# Altium footprint library heromap.PcbLib: 593 footprints (part 24 of 38)
Each footprint in its own frame and in the unit in brackets; x right, y up, seen from the top. Pads: shape width x height; smd on the part's side, far side on the other; paste and mask are expansions set on the pad; w line width, h text height; cw(c..) or ccw(c..) is an arc to the next point about the centre after c.
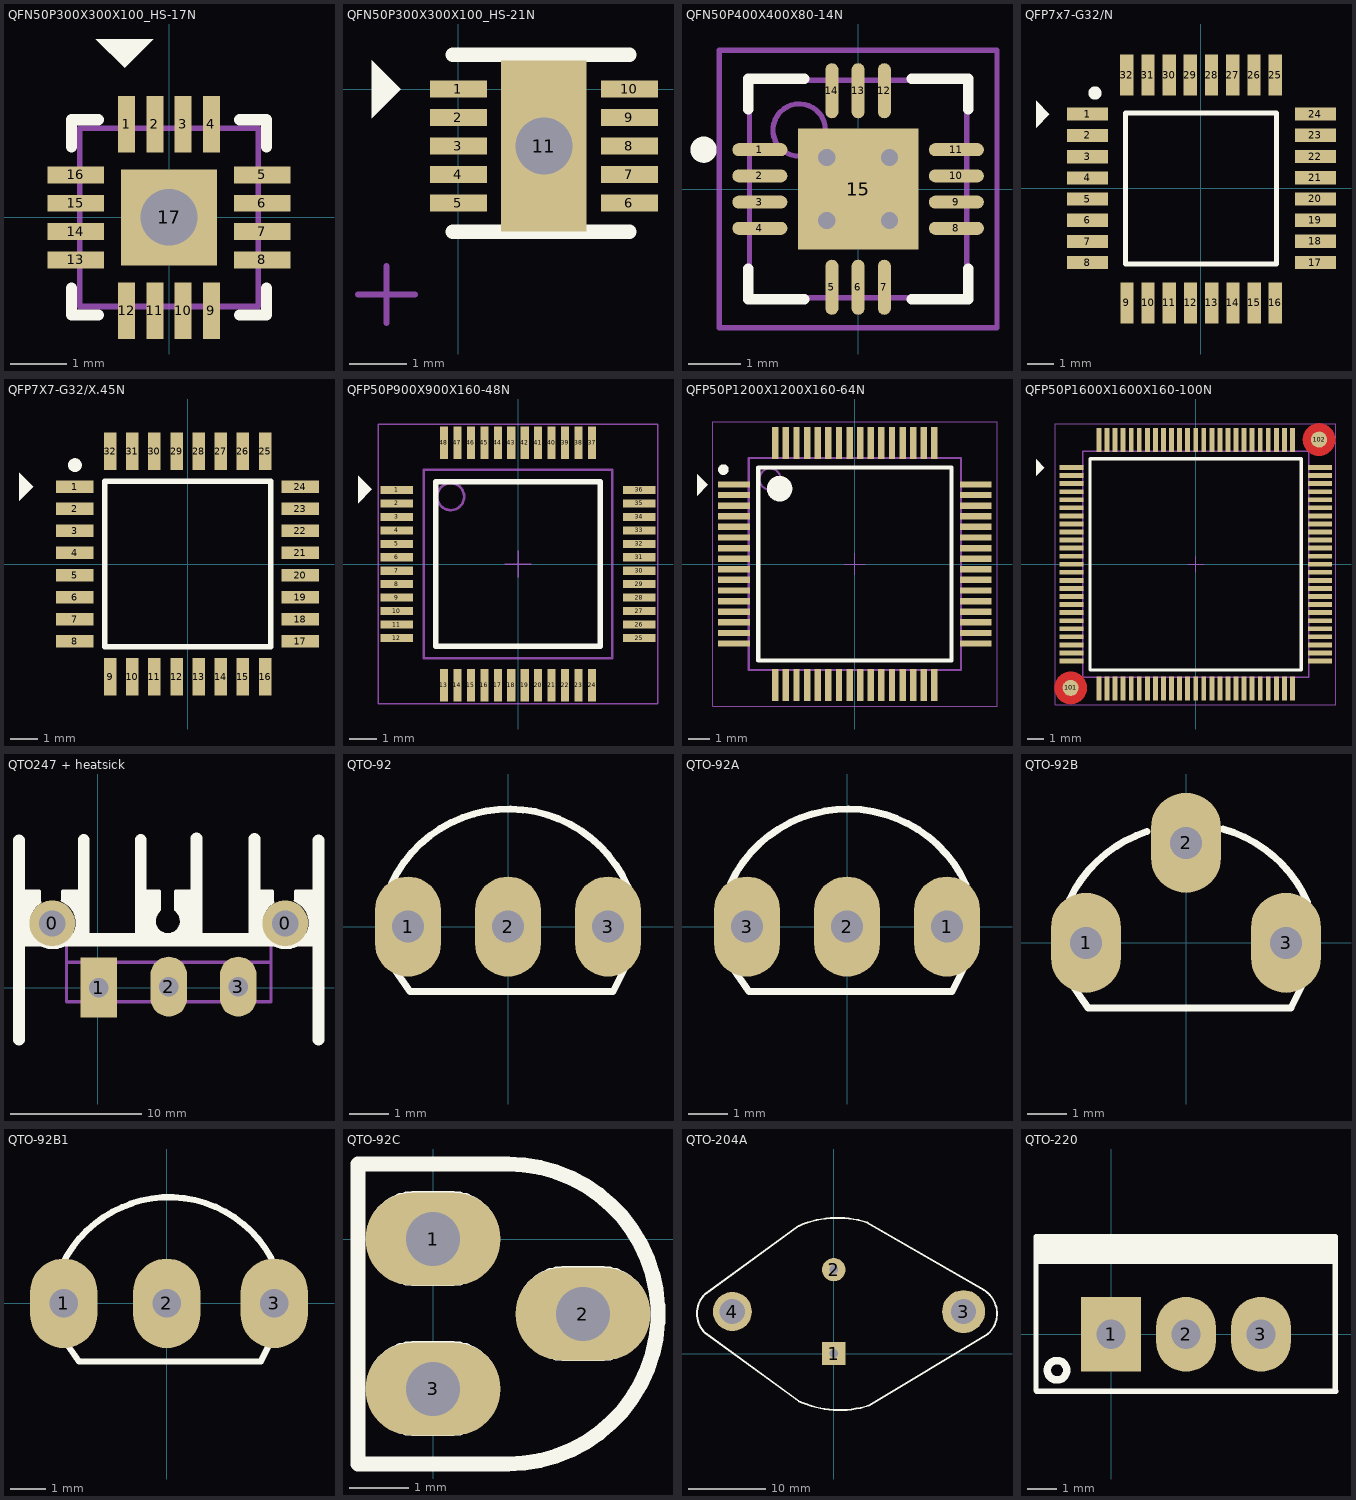
[diagram p23: the footprints below, top view; thin cyan lines are the x and y axes]

## QFN50P300X300X100_HS-17N [mm] "QFN, 16-Leads, Body 3,00x3,00mm, Pitch 0,50mm, Thermal Pad 2,40x1,65mm, IPC Medium Density"
height 1
pads (17):
  rect 0.3x1 smd: 1(-0.75,1.65) 2(-0.25,1.65) 3(0.25,1.65) 4(0.75,1.65) 9(0.75,-1.65) 10(0.25,-1.65) 11(-0.25,-1.65) 12(-0.75,-1.65)
  rect 1x0.3 smd: 5(1.65,0.75) 6(1.65,0.25) 7(1.65,-0.25) 8(1.65,-0.75) 13(-1.65,-0.75) 14(-1.65,-0.25) 15(-1.65,0.25) 16(-1.65,0.75)
  rect 1.7x1.7 smd: 17(0,0)
via 0,0 diameter 1.5 hole 1
Top Overlay:
  region: -0.275,3.154 -0.783,2.646 -1.291,3.154
  lines w0.2: -1.725,-1.25 -1.725,-1.725 -1.25,-1.725 ; -1.725,1.25 -1.725,1.725 -1.25,1.725 ; 1.25,-1.725 1.725,-1.725 1.725,-1.25 ; 1.25,1.725 1.725,1.725 1.725,1.25
Mechanical 13:
  lines w0.1: -1.575,-1.575 1.575,-1.575 1.575,1.575 -1.575,1.575 -1.575,-1.575
Mechanical 15:
  lines w0.1: -0.5,0 0.5,0 ; 0,-0.5 0,0.5
3D body: height 1, standoff 0.01, extent -1.575,-1.575 1.575,1.575

## QFN50P300X300X100_HS-21N [mm] "QFN, 20-Leads, Body 3,00x3,00mm, Pitch 0,50mm, Thermal Pad 2,40x1,65mm, IPC Medium Density"
height 1
pads (11):
  rect 1x0.3 smd: 1(0,0) 2(0,-0.5) 3(0,-1) 4(0,-1.5) 5(0,-2) 6(3,-2) 7(3,-1.5) 8(3,-1) 9(3,-0.5) 10(3,0)
  rect 1.5x3 hole 1: 11(1.5,-1)
Top Overlay:
  region: -1.524,0.508 -1.016,0 -1.524,-0.508
  lines w0.254: -0.1,-2.5 3,-2.5 ; -0.1,0.6 3,0.6
Mechanical 15:
  lines w0.1: -1.762,-3.603 -0.762,-3.603 ; -1.262,-4.103 -1.262,-3.103
3D body: height 1, standoff 0.1, extent -0.1,-2.5 3,0.6

## QFN50P400X400X80-14N [mm] "QFN, 14-Leads, Body 4,2x4,2mm (max), Pitch 0,50mm, IPC Medium Density"
height 0.8
pads (15):
  oval 1.05x0.25 smd: 1(-1.875,0.75) 2(-1.875,0.25) 3(-1.875,-0.25) 4(-1.875,-0.75) 8(1.875,-0.75) 9(1.875,-0.25) 10(1.875,0.25) 11(1.875,0.75)
  oval 0.25x1.05 smd: 5(-0.5,-1.875) 6(0,-1.875) 7(0.5,-1.875) 12(0.5,1.875) 13(0,1.875) 14(-0.5,1.875)
  rect 2.3x2.3 smd: 15(0,0)
via 0.6,-0.6 diameter 0.66 hole 0.33
via -0.6,-0.6 diameter 0.66 hole 0.33
via 0.6,0.6 diameter 0.66 hole 0.33
via -0.6,0.6 diameter 0.66 hole 0.33
Top Overlay:
  circle w0.25: c-2.95,0.75 r0.125
  lines w0.2: -2.1,-1.525 -2.1,-2.1 -1.025,-2.1 ; -2.1,1.525 -2.1,2.1 -1.025,2.1 ; 1.025,-2.1 2.1,-2.1 2.1,-1.525 ; 1.025,2.1 2.1,2.1 2.1,1.525
Mechanical 13:
  circle w0.1: c-1.125,1.125 r0.5
  lines w0.1: -2.075,-2.075 2.075,-2.075 2.075,2.075 -2.075,2.075 -2.075,-2.075
Mechanical 15:
  lines w0.1: -0.5,0 0.5,0 ; 0,-0.5 0,0.5 ; -2.65,-2.65 2.65,-2.65 2.65,2.65 -2.65,2.65 -2.65,-2.65
3D body: height 0.8, standoff 0.01, extent -2.075,-2.075 2.075,2.075

## QFP7x7-G32/N [mm] "32-Pin Plastic Thin Quad Flat Pack (TFQP)"
height 1.2
pads (32):
  rect 1.55x0.5 smd: 1(-4.279,2.806) 2(-4.279,2) 3(-4.279,1.2) 4(-4.279,0.4) 5(-4.279,-0.4) 6(-4.279,-1.2) 7(-4.279,-2) 8(-4.279,-2.794) 17(4.318,-2.794) 18(4.318,-1.994) 19(4.318,-1.194) 20(4.318,-0.394) 21(4.318,0.406) 22(4.318,1.206) 23(4.318,2.006) 24(4.318,2.806)
  rect 0.5x1.55 smd: 9(-2.794,-4.318) 10(-1.994,-4.318) 11(-1.194,-4.318) 12(-0.394,-4.318) 13(0.406,-4.318) 14(1.206,-4.318) 15(2.006,-4.318) 16(2.806,-4.318) 25(2.8,4.279) 26(2,4.279) 27(1.2,4.279) 28(0.4,4.279) 29(-0.4,4.279) 30(-1.2,4.279) 31(-2,4.279) 32(-2.8,4.279)
Top Overlay:
  circle w0.25: c-4,3.6 r0.125
  region: -6.223,3.302 -5.715,2.794 -6.223,2.286
  lines w0.2: -2.85,-2.85 -2.85,2.85 2.85,2.85 2.85,-2.85 -2.85,-2.85
3D body "atmega8 (tqfp32)_V2008.STEP": height 1.13, standoff 0.02, extent -4.774,-4.774 4.826,4.826

## QFP7X7-G32/X.45N [mm] "QFP; 32 Leads; Body 7 x 7 mm; Pitch 0.8 mm"
height 1.6
pads (32):
  rect 1.35x0.45 smd: 1(-4.075,2.8) 2(-4.075,2) 3(-4.075,1.2) 4(-4.075,0.4) 5(-4.075,-0.4) 6(-4.075,-1.2) 7(-4.075,-2) 8(-4.075,-2.8) 17(4.075,-2.8) 18(4.075,-2) 19(4.075,-1.2) 20(4.075,-0.4) 21(4.075,0.4) 22(4.075,1.2) 23(4.075,2) 24(4.075,2.8)
  rect 0.45x1.35 smd: 9(-2.8,-4.075) 10(-2,-4.075) 11(-1.2,-4.075) 12(-0.4,-4.075) 13(0.4,-4.075) 14(1.2,-4.075) 15(2,-4.075) 16(2.8,-4.075) 25(2.8,4.075) 26(2,4.075) 27(1.2,4.075) 28(0.4,4.075) 29(-0.4,4.075) 30(-1.2,4.075) 31(-2,4.075) 32(-2.8,4.075)
Top Overlay:
  circle w0.25: c-4.075,3.575 r0.125
  region: -6.096,3.308 -5.588,2.8 -6.096,2.292
  lines w0.2: -3,-3 3,-3 3,3 -3,3 -3,-3
3D body "atmega8 (tqfp32)_V2008.STEP": height 1.2, standoff 0.09, extent -4.8,-4.8 4.8,4.8

## QFP50P900X900X160-48N [mm] "QFP,0.50mm pitch,square;12 pin X 12 pin,7.00mm X 7.00mm X 1.60mm H body"
height 1.6
pads (48):
  rect 1.2x0.3 smd: 1(-4.5,2.75) 2(-4.5,2.25) 3(-4.5,1.75) 4(-4.5,1.25) 5(-4.5,0.75) 6(-4.5,0.25) 7(-4.5,-0.25) 8(-4.5,-0.75) 9(-4.5,-1.25) 10(-4.5,-1.75) 11(-4.5,-2.25) 12(-4.5,-2.75) 25(4.5,-2.75) 26(4.5,-2.25) 27(4.5,-1.75) 28(4.5,-1.25) 29(4.5,-0.75) 30(4.5,-0.25) 31(4.5,0.25) 32(4.5,0.75) 33(4.5,1.25) 34(4.5,1.75) 35(4.5,2.25) 36(4.5,2.75)
  rect 0.3x1.2 smd: 13(-2.75,-4.5) 14(-2.25,-4.5) 15(-1.75,-4.5) 16(-1.25,-4.5) 17(-0.75,-4.5) 18(-0.25,-4.5) 19(0.25,-4.5) 20(0.75,-4.5) 21(1.25,-4.5) 22(1.75,-4.5) 23(2.25,-4.5) 24(2.75,-4.5) 37(2.75,4.5) 38(2.25,4.5) 39(1.75,4.5) 40(1.25,4.5) 41(0.75,4.5) 42(0.25,4.5) 43(-0.25,4.5) 44(-0.75,4.5) 45(-1.25,4.5) 46(-1.75,4.5) 47(-2.25,4.5) 48(-2.75,4.5)
Top Overlay:
  region: -5.944,3.277 -5.436,2.769 -5.944,2.261
  lines w0.2: -3.05,-3.05 3.05,-3.05 3.05,3.05 -3.05,3.05 -3.05,-3.05
Mechanical 12:
  lines w0.001: -3.5,-3.5 3.5,-3.5 3.5,3.5 -3.5,3.5 -3.5,-3.5
Mechanical 13:
  circle w0.1: c-2.5,2.5 r0.5
  lines w0.1: -3.5,-3.5 3.5,-3.5 3.5,3.5 -3.5,3.5 -3.5,-3.5
Mechanical 15:
  lines w0.05: -0.5,0 0.5,0 ; 0,-0.5 0,0.5 ; -5.2,-5.2 5.2,-5.2 5.2,5.2 -5.2,5.2 -5.2,-5.2
3D body "SW3dPS-P-LQFP48-7x7-0.50.STEP": height 1.42, standoff -0.03, extent -4.496,-4.496 4.504,4.504

## QFP50P1200X1200X160-64N [mm] "QFP,0.50mm pitch,square;16 pin X 16 pin,10.00mm X 10.00mm X 1.60mm H body"
height 1.6
pads (64):
  rect 1.5x0.3 smd: 1(-5.7,3.75) 2(-5.7,3.25) 3(-5.7,2.75) 4(-5.7,2.25) 5(-5.7,1.75) 6(-5.7,1.25) 7(-5.7,0.75) 8(-5.7,0.25) 9(-5.7,-0.25) 10(-5.7,-0.75) 11(-5.7,-1.25) 12(-5.7,-1.75) 13(-5.7,-2.25) 14(-5.7,-2.75) 15(-5.7,-3.25) 16(-5.7,-3.75) 33(5.7,-3.75) 34(5.7,-3.25) 35(5.7,-2.75) 36(5.7,-2.25) 37(5.7,-1.75) 38(5.7,-1.25) 39(5.7,-0.75) 40(5.7,-0.25) 41(5.7,0.25) 42(5.7,0.75) 43(5.7,1.25) 44(5.7,1.75) 45(5.7,2.25) 46(5.7,2.75) 47(5.7,3.25) 48(5.7,3.75)
  rect 0.3x1.5 smd: 17(-3.75,-5.7) 18(-3.25,-5.7) 19(-2.75,-5.7) 20(-2.25,-5.7) 21(-1.75,-5.7) 22(-1.25,-5.7) 23(-0.75,-5.7) 24(-0.25,-5.7) 25(0.25,-5.7) 26(0.75,-5.7) 27(1.25,-5.7) 28(1.75,-5.7) 29(2.25,-5.7) 30(2.75,-5.7) 31(3.25,-5.7) 32(3.75,-5.7) 49(3.75,5.7) 50(3.25,5.7) 51(2.75,5.7) 52(2.25,5.7) 53(1.75,5.7) 54(1.25,5.7) 55(0.75,5.7) 56(0.25,5.7) 57(-0.25,5.7) 58(-0.75,5.7) 59(-1.25,5.7) 60(-1.75,5.7) 61(-2.25,5.7) 62(-2.75,5.7) 63(-3.25,5.7) 64(-3.75,5.7)
Top Overlay:
  circle w0.6: c-3.55,3.55 r0.3
  circle w0.25: c-6.2,4.45 r0.125
  region: -7.442,4.242 -6.934,3.734 -7.442,3.226
  lines w0.2: -4.55,-4.55 4.55,-4.55 4.55,4.55 -4.55,4.55 -4.55,-4.55
Mechanical 12:
  lines w0.001: -5,-5 5,-5 5,5 -5,5 -5,-5
Mechanical 13:
  circle w0.1: c-4,4 r0.5
  lines w0.1: -5,-5 5,-5 5,5 -5,5 -5,-5
Mechanical 15:
  lines w0.05: -0.5,0 0.5,0 ; 0,-0.5 0,0.5 ; -6.7,-6.7 6.7,-6.7 6.7,6.7 -6.7,6.7 -6.7,-6.7

## QFP50P1600X1600X160-100N [mm] "QFP,0.50mm pitch,square;25 pin X 25 pin,14.00mm X 14.00mm X 1.60mm H body"
height 1.6
pads (102):
  rect 1.5x0.3 smd: 1(-7.7,6) 2(-7.7,5.5) 3(-7.7,5) 4(-7.7,4.5) 5(-7.7,4) 6(-7.7,3.5) 7(-7.7,3) 8(-7.7,2.5) 9(-7.7,2) 10(-7.7,1.5) 11(-7.7,1) 12(-7.7,0.5) 13(-7.7,0) 14(-7.7,-0.5) 15(-7.7,-1) 16(-7.7,-1.5) 17(-7.7,-2) 18(-7.7,-2.5) 19(-7.7,-3) 20(-7.7,-3.5) 21(-7.7,-4) 22(-7.7,-4.5) 23(-7.7,-5) 24(-7.7,-5.5) 25(-7.7,-6) 51(7.7,-6) 52(7.7,-5.5) 53(7.7,-5) 54(7.7,-4.5) 55(7.7,-4) 56(7.7,-3.5) 57(7.7,-3) 58(7.7,-2.5) 59(7.7,-2) 60(7.7,-1.5) 61(7.7,-1) 62(7.7,-0.5) 63(7.7,0) 64(7.7,0.5) 65(7.7,1) 66(7.7,1.5) 67(7.7,2) 68(7.7,2.5) 69(7.7,3) 70(7.7,3.5) 71(7.7,4) 72(7.7,4.5) 73(7.7,5) 74(7.7,5.5) 75(7.7,6)
  rect 0.3x1.5 smd: 26(-6,-7.7) 27(-5.5,-7.7) 28(-5,-7.7) 29(-4.5,-7.7) 30(-4,-7.7) 31(-3.5,-7.7) 32(-3,-7.7) 33(-2.5,-7.7) 34(-2,-7.7) 35(-1.5,-7.7) 36(-1,-7.7) 37(-0.5,-7.7) 38(0,-7.7) 39(0.5,-7.7) 40(1,-7.7) 41(1.5,-7.7) 42(2,-7.7) 43(2.5,-7.7) 44(3,-7.7) 45(3.5,-7.7) 46(4,-7.7) 47(4.5,-7.7) 48(5,-7.7) 49(5.5,-7.7) 50(6,-7.7) 76(6,7.7) 77(5.5,7.7) 78(5,7.7) 79(4.5,7.7) 80(4,7.7) 81(3.5,7.7) 82(3,7.7) 83(2.5,7.7) 84(2,7.7) 85(1.5,7.7) 86(1,7.7) 87(0.5,7.7) 88(0,7.7) 89(-0.5,7.7) 90(-1,7.7) 91(-1.5,7.7) 92(-2,7.7) 93(-2.5,7.7) 94(-3,7.7) 95(-3.5,7.7) 96(-4,7.7) 97(-4.5,7.7) 98(-5,7.7) 99(-5.5,7.7) 100(-6,7.7)
  round 1 smd: 101(-7.753,-7.669) 102(7.647,7.731)
Top Layer:
  pour cut-out: 153 vertices and 0 holes, not listed, extent -8.753,-8.669 -6.753,-6.669
  pour cut-out: 153 vertices and 0 holes, not listed, extent 6.647,6.731 8.647,8.731
Top Overlay:
  region: -9.906,6.508 -9.398,6 -9.906,5.492
  lines w0.2: -6.55,-6.55 -6.55,6.55 6.55,6.55 6.55,-6.55 -6.55,-6.55
Mechanical 12:
  lines w0.001: -7,-7 -7,7 7,7 7,-7 -7,-7
Mechanical 13:
  lines w0.1: -7,-7 -7,7 ; -7,-7 7,-7 ; -7,-7 -7,7 ; -7,-7 7,-7 ; -7,7 7,7 ; -7,7 7,7 ; 7,-7 7,7 ; 7,-7 7,7
Mechanical 15:
  lines w0.05: -0.5,0 0.5,0 ; 0,-0.5 0,0.5 ; -8.7,-8.7 -8.7,8.7 8.7,8.7 8.7,-8.7 -8.7,-8.7
3D body: height 1.6, standoff 0.05, extent -7,-7 7,7
3D body: height 0.85, standoff 0.75, extent -7.264,5.85 -6.807,6.147
3D body: height 0.85, standoff 0, extent -7.351,5.85 -7.264,6.147
3D body: height 0.1, standoff 0, extent -8.085,5.85 -7.351,6.147
3D body: height 0.1, standoff 0, extent -8.085,5.35 -7.351,5.647
3D body: height 0.85, standoff 0, extent -7.351,5.35 -7.264,5.647
3D body: height 0.85, standoff 0.75, extent -7.264,5.35 -6.807,5.647
3D body: height 0.1, standoff 0, extent -8.085,4.85 -7.351,5.147
3D body: height 0.85, standoff 0, extent -7.351,4.85 -7.264,5.147
3D body: height 0.85, standoff 0.75, extent -7.264,4.85 -6.807,5.147
3D body: height 0.85, standoff 0.75, extent -7.264,3.35 -6.807,3.647
3D body: height 0.85, standoff 0, extent -7.351,3.35 -7.264,3.647
3D body: height 0.1, standoff 0, extent -8.085,3.35 -7.351,3.647
3D body: height 0.85, standoff 0.75, extent -7.264,3.85 -6.807,4.147
3D body: height 0.85, standoff 0, extent -7.351,3.85 -7.264,4.147
3D body: height 0.1, standoff 0, extent -8.085,3.85 -7.351,4.147
3D body: height 0.1, standoff 0, extent -8.085,4.35 -7.351,4.647
3D body: height 0.85, standoff 0, extent -7.351,4.35 -7.264,4.647
3D body: height 0.85, standoff 0.75, extent -7.264,4.35 -6.807,4.647
3D body: height 0.85, standoff 0.75, extent -7.264,1.85 -6.807,2.147
3D body: height 0.85, standoff 0, extent -7.351,1.85 -7.264,2.147
3D body: height 0.1, standoff 0, extent -8.085,1.85 -7.351,2.147
3D body: height 0.1, standoff 0, extent -8.085,1.35 -7.351,1.647
3D body: height 0.85, standoff 0, extent -7.351,1.35 -7.264,1.647
3D body: height 0.85, standoff 0.75, extent -7.264,1.35 -6.807,1.647
3D body: height 0.85, standoff 0.75, extent -7.264,2.35 -6.807,2.647
3D body: height 0.85, standoff 0, extent -7.351,2.35 -7.264,2.647
3D body: height 0.1, standoff 0, extent -8.085,2.35 -7.351,2.647
3D body: height 0.85, standoff 0.75, extent -7.264,2.85 -6.807,3.147
3D body: height 0.85, standoff 0, extent -7.351,2.85 -7.264,3.147
3D body: height 0.1, standoff 0, extent -8.085,2.85 -7.351,3.147
3D body: height 0.1, standoff 0, extent -8.085,3.35 -7.351,3.647
3D body: height 0.85, standoff 0, extent -7.351,3.35 -7.264,3.647
3D body: height 0.85, standoff 0.75, extent -7.264,3.35 -6.807,3.647
3D body: height 0.85, standoff 0.75, extent -7.264,-0.65 -6.807,-0.353
3D body: height 0.85, standoff 0, extent -7.351,-0.65 -7.264,-0.353
3D body: height 0.1, standoff 0, extent -8.085,-0.65 -7.351,-0.353
3D body: height 0.1, standoff 0, extent -8.085,-1.15 -7.351,-0.853
3D body: height 0.85, standoff 0, extent -7.351,-1.15 -7.264,-0.853
3D body: height 0.85, standoff 0.75, extent -7.264,-1.15 -6.807,-0.853
3D body: height 0.85, standoff 0.75, extent -7.264,-0.15 -6.807,0.147
3D body: height 0.85, standoff 0, extent -7.351,-0.15 -7.264,0.147
3D body: height 0.1, standoff 0, extent -8.085,-0.15 -7.351,0.147
3D body: height 0.85, standoff 0.75, extent -7.264,0.35 -6.807,0.647
3D body: height 0.85, standoff 0, extent -7.351,0.35 -7.264,0.647
3D body: height 0.1, standoff 0, extent -8.085,0.35 -7.351,0.647
3D body: height 0.1, standoff 0, extent -8.085,0.85 -7.351,1.147
3D body: height 0.85, standoff 0, extent -7.351,0.85 -7.264,1.147
3D body: height 0.85, standoff 0.75, extent -7.264,0.85 -6.807,1.147
3D body: height 0.85, standoff 0.75, extent -7.264,-3.15 -6.807,-2.853
3D body: height 0.85, standoff 0, extent -7.351,-3.15 -7.264,-2.853
3D body: height 0.1, standoff 0, extent -8.085,-3.15 -7.351,-2.853
3D body: height 0.1, standoff 0, extent -8.085,-3.65 -7.351,-3.353
3D body: height 0.85, standoff 0, extent -7.351,-3.65 -7.264,-3.353
3D body: height 0.85, standoff 0.75, extent -7.264,-3.65 -6.807,-3.353
3D body: height 0.85, standoff 0.75, extent -7.264,-2.65 -6.807,-2.353
3D body: height 0.85, standoff 0, extent -7.351,-2.65 -7.264,-2.353
3D body: height 0.1, standoff 0, extent -8.085,-2.65 -7.351,-2.353
3D body: height 0.85, standoff 0.75, extent -7.264,-2.15 -6.807,-1.853
3D body: height 0.85, standoff 0, extent -7.351,-2.15 -7.264,-1.853
3D body: height 0.1, standoff 0, extent -8.085,-2.15 -7.351,-1.853
3D body: height 0.1, standoff 0, extent -8.085,-1.65 -7.351,-1.353
3D body: height 0.85, standoff 0, extent -7.351,-1.65 -7.264,-1.353
3D body: height 0.85, standoff 0.75, extent -7.264,-1.65 -6.807,-1.353
3D body: height 0.85, standoff 0.75, extent -7.264,-5.65 -6.807,-5.353
3D body: height 0.85, standoff 0, extent -7.351,-5.65 -7.264,-5.353
3D body: height 0.1, standoff 0, extent -8.085,-5.65 -7.351,-5.353
3D body: height 0.1, standoff 0, extent -8.085,-6.15 -7.351,-5.853
3D body: height 0.85, standoff 0, extent -7.351,-6.15 -7.264,-5.853
3D body: height 0.85, standoff 0.75, extent -7.264,-6.15 -6.807,-5.853
3D body: height 0.85, standoff 0.75, extent -7.264,-5.15 -6.807,-4.853
3D body: height 0.85, standoff 0, extent -7.351,-5.15 -7.264,-4.853
3D body: height 0.1, standoff 0, extent -8.085,-5.15 -7.351,-4.853
3D body: height 0.85, standoff 0.75, extent -7.264,-4.65 -6.807,-4.353
3D body: height 0.85, standoff 0, extent -7.351,-4.65 -7.264,-4.353
3D body: height 0.1, standoff 0, extent -8.085,-4.65 -7.351,-4.353
3D body: height 0.1, standoff 0, extent -8.085,-4.15 -7.351,-3.853
3D body: height 0.85, standoff 0, extent -7.351,-4.15 -7.264,-3.853
3D body: height 0.85, standoff 0.75, extent -7.264,-4.15 -6.807,-3.853
3D body: height 0.85, standoff 0.75, extent 3.853,-7.264 4.15,-6.807
3D body: height 0.85, standoff 0, extent 3.853,-7.351 4.15,-7.264
3D body: height 0.1, standoff 0, extent 3.853,-8.085 4.15,-7.351
3D body: height 0.1, standoff 0, extent 4.353,-8.085 4.65,-7.351
3D body: height 0.85, standoff 0, extent 4.353,-7.351 4.65,-7.264
3D body: height 0.85, standoff 0.75, extent 4.353,-7.264 4.65,-6.807
3D body: height 0.1, standoff 0, extent 4.853,-8.085 5.15,-7.351
3D body: height 0.85, standoff 0, extent 4.853,-7.351 5.15,-7.264
3D body: height 0.85, standoff 0.75, extent 4.853,-7.264 5.15,-6.807
3D body: height 0.85, standoff 0.75, extent 5.853,-7.264 6.15,-6.807
3D body: height 0.85, standoff 0, extent 5.853,-7.351 6.15,-7.264
3D body: height 0.1, standoff 0, extent 5.853,-8.085 6.15,-7.351
3D body: height 0.1, standoff 0, extent 5.353,-8.085 5.65,-7.351
3D body: height 0.85, standoff 0, extent 5.353,-7.351 5.65,-7.264
3D body: height 0.85, standoff 0.75, extent 5.353,-7.264 5.65,-6.807
3D body: height 0.85, standoff 0.75, extent 1.353,-7.264 1.65,-6.807
3D body: height 0.85, standoff 0, extent 1.353,-7.351 1.65,-7.264
3D body: height 0.1, standoff 0, extent 1.353,-8.085 1.65,-7.351
3D body: height 0.1, standoff 0, extent 1.853,-8.085 2.15,-7.351
3D body: height 0.85, standoff 0, extent 1.853,-7.351 2.15,-7.264
3D body: height 0.85, standoff 0.75, extent 1.853,-7.264 2.15,-6.807
3D body: height 0.1, standoff 0, extent 2.353,-8.085 2.65,-7.351
3D body: height 0.85, standoff 0, extent 2.353,-7.351 2.65,-7.264
3D body: height 0.85, standoff 0.75, extent 2.353,-7.264 2.65,-6.807
3D body: height 0.85, standoff 0.75, extent 3.353,-7.264 3.65,-6.807
3D body: height 0.85, standoff 0, extent 3.353,-7.351 3.65,-7.264
3D body: height 0.1, standoff 0, extent 3.353,-8.085 3.65,-7.351
3D body: height 0.1, standoff 0, extent 2.853,-8.085 3.15,-7.351
3D body: height 0.85, standoff 0, extent 2.853,-7.351 3.15,-7.264
3D body: height 0.85, standoff 0.75, extent 2.853,-7.264 3.15,-6.807
3D body: height 0.85, standoff 0.75, extent -1.147,-7.264 -0.85,-6.807
3D body: height 0.85, standoff 0, extent -1.147,-7.351 -0.85,-7.264
3D body: height 0.1, standoff 0, extent -1.147,-8.085 -0.85,-7.351
3D body: height 0.1, standoff 0, extent -0.647,-8.085 -0.35,-7.351
3D body: height 0.85, standoff 0, extent -0.647,-7.351 -0.35,-7.264
3D body: height 0.85, standoff 0.75, extent -0.647,-7.264 -0.35,-6.807
3D body: height 0.1, standoff 0, extent -0.147,-8.085 0.15,-7.351
3D body: height 0.85, standoff 0, extent -0.147,-7.351 0.15,-7.264
3D body: height 0.85, standoff 0.75, extent -0.147,-7.264 0.15,-6.807
3D body: height 0.85, standoff 0.75, extent 0.853,-7.264 1.15,-6.807
3D body: height 0.85, standoff 0, extent 0.853,-7.351 1.15,-7.264
3D body: height 0.1, standoff 0, extent 0.853,-8.085 1.15,-7.351
3D body: height 0.1, standoff 0, extent 0.353,-8.085 0.65,-7.351
3D body: height 0.85, standoff 0, extent 0.353,-7.351 0.65,-7.264
3D body: height 0.85, standoff 0.75, extent 0.353,-7.264 0.65,-6.807
3D body: height 0.85, standoff 0.75, extent -3.647,-7.264 -3.35,-6.807
3D body: height 0.85, standoff 0, extent -3.647,-7.351 -3.35,-7.264
3D body: height 0.1, standoff 0, extent -3.647,-8.085 -3.35,-7.351
3D body: height 0.1, standoff 0, extent -3.147,-8.085 -2.85,-7.351
3D body: height 0.85, standoff 0, extent -3.147,-7.351 -2.85,-7.264
3D body: height 0.85, standoff 0.75, extent -3.147,-7.264 -2.85,-6.807
3D body: height 0.1, standoff 0, extent -2.647,-8.085 -2.35,-7.351
3D body: height 0.85, standoff 0, extent -2.647,-7.351 -2.35,-7.264
3D body: height 0.85, standoff 0.75, extent -2.647,-7.264 -2.35,-6.807
3D body: height 0.85, standoff 0.75, extent -1.647,-7.264 -1.35,-6.807
3D body: height 0.85, standoff 0, extent -1.647,-7.351 -1.35,-7.264
3D body: height 0.1, standoff 0, extent -1.647,-8.085 -1.35,-7.351
3D body: height 0.1, standoff 0, extent -2.147,-8.085 -1.85,-7.351
3D body: height 0.85, standoff 0, extent -2.147,-7.351 -1.85,-7.264
3D body: height 0.85, standoff 0.75, extent -2.147,-7.264 -1.85,-6.807
3D body: height 0.85, standoff 0.75, extent -4.647,-7.264 -4.35,-6.807
3D body: height 0.85, standoff 0, extent -4.647,-7.351 -4.35,-7.264
3D body: height 0.1, standoff 0, extent -4.647,-8.085 -4.35,-7.351
3D body: height 0.1, standoff 0, extent -4.147,-8.085 -3.85,-7.351
3D body: height 0.85, standoff 0, extent -4.147,-7.351 -3.85,-7.264
3D body: height 0.85, standoff 0.75, extent -4.147,-7.264 -3.85,-6.807
3D body: height 0.1, standoff 0, extent -3.647,-8.085 -3.35,-7.351
3D body: height 0.85, standoff 0, extent -3.647,-7.351 -3.35,-7.264
3D body: height 0.85, standoff 0.75, extent -3.647,-7.264 -3.35,-6.807
3D body: height 0.85, standoff 0.75, extent -5.147,-7.264 -4.85,-6.807
3D body: height 0.85, standoff 0, extent -5.147,-7.351 -4.85,-7.264
3D body: height 0.1, standoff 0, extent -5.147,-8.085 -4.85,-7.351
3D body: height 0.85, standoff 0.75, extent -5.647,-7.264 -5.35,-6.807
3D body: height 0.85, standoff 0, extent -5.647,-7.351 -5.35,-7.264
3D body: height 0.1, standoff 0, extent -5.647,-8.085 -5.35,-7.351
3D body: height 0.1, standoff 0, extent -6.147,-8.085 -5.85,-7.351
3D body: height 0.85, standoff 0, extent -6.147,-7.351 -5.85,-7.264
3D body: height 0.85, standoff 0.75, extent -6.147,-7.264 -5.85,-6.807
3D body: height 0.85, standoff 0.75, extent 6.807,3.853 7.264,4.15
3D body: height 0.85, standoff 0, extent 7.264,3.853 7.351,4.15
3D body: height 0.1, standoff 0, extent 7.351,3.853 8.085,4.15
3D body: height 0.1, standoff 0, extent 7.351,4.353 8.085,4.65
3D body: height 0.85, standoff 0, extent 7.264,4.353 7.351,4.65
3D body: height 0.85, standoff 0.75, extent 6.807,4.353 7.264,4.65
3D body: height 0.1, standoff 0, extent 7.351,4.853 8.085,5.15
3D body: height 0.85, standoff 0, extent 7.264,4.853 7.351,5.15
3D body: height 0.85, standoff 0.75, extent 6.807,4.853 7.264,5.15
3D body: height 0.85, standoff 0.75, extent 6.807,5.853 7.264,6.15
3D body: height 0.85, standoff 0, extent 7.264,5.853 7.351,6.15
3D body: height 0.1, standoff 0, extent 7.351,5.853 8.085,6.15
3D body: height 0.1, standoff 0, extent 7.351,5.353 8.085,5.65
3D body: height 0.85, standoff 0, extent 7.264,5.353 7.351,5.65
3D body: height 0.85, standoff 0.75, extent 6.807,5.353 7.264,5.65
3D body: height 0.85, standoff 0.75, extent 6.807,1.353 7.264,1.65
3D body: height 0.85, standoff 0, extent 7.264,1.353 7.351,1.65
3D body: height 0.1, standoff 0, extent 7.351,1.353 8.085,1.65
3D body: height 0.1, standoff 0, extent 7.351,1.853 8.085,2.15
3D body: height 0.85, standoff 0, extent 7.264,1.853 7.351,2.15
3D body: height 0.85, standoff 0.75, extent 6.807,1.853 7.264,2.15
3D body: height 0.1, standoff 0, extent 7.351,2.353 8.085,2.65
3D body: height 0.85, standoff 0, extent 7.264,2.353 7.351,2.65
3D body: height 0.85, standoff 0.75, extent 6.807,2.353 7.264,2.65
3D body: height 0.85, standoff 0.75, extent 6.807,3.353 7.264,3.65
3D body: height 0.85, standoff 0, extent 7.264,3.353 7.351,3.65
3D body: height 0.1, standoff 0, extent 7.351,3.353 8.085,3.65
3D body: height 0.1, standoff 0, extent 7.351,2.853 8.085,3.15
3D body: height 0.85, standoff 0, extent 7.264,2.853 7.351,3.15
3D body: height 0.85, standoff 0.75, extent 6.807,2.853 7.264,3.15
3D body: height 0.85, standoff 0.75, extent 6.807,-1.147 7.264,-0.85
3D body: height 0.85, standoff 0, extent 7.264,-1.147 7.351,-0.85
3D body: height 0.1, standoff 0, extent 7.351,-1.147 8.085,-0.85
3D body: height 0.1, standoff 0, extent 7.351,-0.647 8.085,-0.35
3D body: height 0.85, standoff 0, extent 7.264,-0.647 7.351,-0.35
3D body: height 0.85, standoff 0.75, extent 6.807,-0.647 7.264,-0.35
3D body: height 0.1, standoff 0, extent 7.351,-0.147 8.085,0.15
3D body: height 0.85, standoff 0, extent 7.264,-0.147 7.351,0.15
3D body: height 0.85, standoff 0.75, extent 6.807,-0.147 7.264,0.15
3D body: height 0.85, standoff 0.75, extent 6.807,0.853 7.264,1.15
3D body: height 0.85, standoff 0, extent 7.264,0.853 7.351,1.15
3D body: height 0.1, standoff 0, extent 7.351,0.853 8.085,1.15
3D body: height 0.1, standoff 0, extent 7.351,0.353 8.085,0.65
3D body: height 0.85, standoff 0, extent 7.264,0.353 7.351,0.65
3D body: height 0.85, standoff 0.75, extent 6.807,0.353 7.264,0.65
3D body: height 0.85, standoff 0.75, extent 6.807,-3.647 7.264,-3.35
3D body: height 0.85, standoff 0, extent 7.264,-3.647 7.351,-3.35
3D body: height 0.1, standoff 0, extent 7.351,-3.647 8.085,-3.35
3D body: height 0.1, standoff 0, extent 7.351,-3.147 8.085,-2.85
3D body: height 0.85, standoff 0, extent 7.264,-3.147 7.351,-2.85
3D body: height 0.85, standoff 0.75, extent 6.807,-3.147 7.264,-2.85
3D body: height 0.1, standoff 0, extent 7.351,-2.647 8.085,-2.35
3D body: height 0.85, standoff 0, extent 7.264,-2.647 7.351,-2.35
3D body: height 0.85, standoff 0.75, extent 6.807,-2.647 7.264,-2.35
3D body: height 0.85, standoff 0.75, extent 6.807,-1.647 7.264,-1.35
3D body: height 0.85, standoff 0, extent 7.264,-1.647 7.351,-1.35
3D body: height 0.1, standoff 0, extent 7.351,-1.647 8.085,-1.35
3D body: height 0.1, standoff 0, extent 7.351,-2.147 8.085,-1.85
3D body: height 0.85, standoff 0, extent 7.264,-2.147 7.351,-1.85
3D body: height 0.85, standoff 0.75, extent 6.807,-2.147 7.264,-1.85
3D body: height 0.85, standoff 0.75, extent 6.807,-4.647 7.264,-4.35
3D body: height 0.85, standoff 0, extent 7.264,-4.647 7.351,-4.35
3D body: height 0.1, standoff 0, extent 7.351,-4.647 8.085,-4.35
3D body: height 0.1, standoff 0, extent 7.351,-4.147 8.085,-3.85
3D body: height 0.85, standoff 0, extent 7.264,-4.147 7.351,-3.85
3D body: height 0.85, standoff 0.75, extent 6.807,-4.147 7.264,-3.85
3D body: height 0.1, standoff 0, extent 7.351,-3.647 8.085,-3.35
3D body: height 0.85, standoff 0, extent 7.264,-3.647 7.351,-3.35
3D body: height 0.85, standoff 0.75, extent 6.807,-3.647 7.264,-3.35
3D body: height 0.85, standoff 0.75, extent 6.807,-5.147 7.264,-4.85
3D body: height 0.85, standoff 0, extent 7.264,-5.147 7.351,-4.85
3D body: height 0.1, standoff 0, extent 7.351,-5.147 8.085,-4.85
3D body: height 0.85, standoff 0.75, extent 6.807,-5.647 7.264,-5.35
3D body: height 0.85, standoff 0, extent 7.264,-5.647 7.351,-5.35
3D body: height 0.1, standoff 0, extent 7.351,-5.647 8.085,-5.35
3D body: height 0.1, standoff 0, extent 7.351,-6.147 8.085,-5.85
3D body: height 0.85, standoff 0, extent 7.264,-6.147 7.351,-5.85
3D body: height 0.85, standoff 0.75, extent 6.807,-6.147 7.264,-5.85
3D body: height 0.85, standoff 0.75, extent -4.15,6.807 -3.853,7.264
3D body: height 0.85, standoff 0, extent -4.15,7.264 -3.853,7.351
3D body: height 0.1, standoff 0, extent -4.15,7.351 -3.853,8.085
3D body: height 0.1, standoff 0, extent -4.65,7.351 -4.353,8.085
3D body: height 0.85, standoff 0, extent -4.65,7.264 -4.353,7.351
3D body: height 0.85, standoff 0.75, extent -4.65,6.807 -4.353,7.264
3D body: height 0.1, standoff 0, extent -5.15,7.351 -4.853,8.085
3D body: height 0.85, standoff 0, extent -5.15,7.264 -4.853,7.351
3D body: height 0.85, standoff 0.75, extent -5.15,6.807 -4.853,7.264
3D body: height 0.85, standoff 0.75, extent -6.15,6.807 -5.853,7.264
3D body: height 0.85, standoff 0, extent -6.15,7.264 -5.853,7.351
3D body: height 0.1, standoff 0, extent -6.15,7.351 -5.853,8.085
3D body: height 0.1, standoff 0, extent -5.65,7.351 -5.353,8.085
3D body: height 0.85, standoff 0, extent -5.65,7.264 -5.353,7.351
3D body: height 0.85, standoff 0.75, extent -5.65,6.807 -5.353,7.264
3D body: height 0.85, standoff 0.75, extent -1.65,6.807 -1.353,7.264
3D body: height 0.85, standoff 0, extent -1.65,7.264 -1.353,7.351
3D body: height 0.1, standoff 0, extent -1.65,7.351 -1.353,8.085
3D body: height 0.1, standoff 0, extent -2.15,7.351 -1.853,8.085
3D body: height 0.85, standoff 0, extent -2.15,7.264 -1.853,7.351
3D body: height 0.85, standoff 0.75, extent -2.15,6.807 -1.853,7.264
3D body: height 0.1, standoff 0, extent -2.65,7.351 -2.353,8.085
3D body: height 0.85, standoff 0, extent -2.65,7.264 -2.353,7.351
3D body: height 0.85, standoff 0.75, extent -2.65,6.807 -2.353,7.264
3D body: height 0.85, standoff 0.75, extent -3.65,6.807 -3.353,7.264
3D body: height 0.85, standoff 0, extent -3.65,7.264 -3.353,7.351
3D body: height 0.1, standoff 0, extent -3.65,7.351 -3.353,8.085
3D body: height 0.1, standoff 0, extent -3.15,7.351 -2.853,8.085
3D body: height 0.85, standoff 0, extent -3.15,7.264 -2.853,7.351
3D body: height 0.85, standoff 0.75, extent -3.15,6.807 -2.853,7.264
3D body: height 0.85, standoff 0.75, extent 0.85,6.807 1.147,7.264
3D body: height 0.85, standoff 0, extent 0.85,7.264 1.147,7.351
3D body: height 0.1, standoff 0, extent 0.85,7.351 1.147,8.085
3D body: height 0.1, standoff 0, extent 0.35,7.351 0.647,8.085
3D body: height 0.85, standoff 0, extent 0.35,7.264 0.647,7.351
3D body: height 0.85, standoff 0.75, extent 0.35,6.807 0.647,7.264
3D body: height 0.1, standoff 0, extent -0.15,7.351 0.147,8.085
3D body: height 0.85, standoff 0, extent -0.15,7.264 0.147,7.351
3D body: height 0.85, standoff 0.75, extent -0.15,6.807 0.147,7.264
3D body: height 0.85, standoff 0.75, extent -1.15,6.807 -0.853,7.264
3D body: height 0.85, standoff 0, extent -1.15,7.264 -0.853,7.351
3D body: height 0.1, standoff 0, extent -1.15,7.351 -0.853,8.085
3D body: height 0.1, standoff 0, extent -0.65,7.351 -0.353,8.085
3D body: height 0.85, standoff 0, extent -0.65,7.264 -0.353,7.351
3D body: height 0.85, standoff 0.75, extent -0.65,6.807 -0.353,7.264
3D body: height 0.85, standoff 0.75, extent 3.35,6.807 3.647,7.264
3D body: height 0.85, standoff 0, extent 3.35,7.264 3.647,7.351
3D body: height 0.1, standoff 0, extent 3.35,7.351 3.647,8.085
3D body: height 0.1, standoff 0, extent 2.85,7.351 3.147,8.085
3D body: height 0.85, standoff 0, extent 2.85,7.264 3.147,7.351
3D body: height 0.85, standoff 0.75, extent 2.85,6.807 3.147,7.264
3D body: height 0.1, standoff 0, extent 2.35,7.351 2.647,8.085
3D body: height 0.85, standoff 0, extent 2.35,7.264 2.647,7.351
3D body: height 0.85, standoff 0.75, extent 2.35,6.807 2.647,7.264
3D body: height 0.85, standoff 0.75, extent 1.35,6.807 1.647,7.264
3D body: height 0.85, standoff 0, extent 1.35,7.264 1.647,7.351
3D body: height 0.1, standoff 0, extent 1.35,7.351 1.647,8.085
3D body: height 0.1, standoff 0, extent 1.85,7.351 2.147,8.085
3D body: height 0.85, standoff 0, extent 1.85,7.264 2.147,7.351
3D body: height 0.85, standoff 0.75, extent 1.85,6.807 2.147,7.264
3D body: height 0.85, standoff 0.75, extent 4.35,6.807 4.647,7.264
3D body: height 0.85, standoff 0, extent 4.35,7.264 4.647,7.351
3D body: height 0.1, standoff 0, extent 4.35,7.351 4.647,8.085
3D body: height 0.1, standoff 0, extent 3.85,7.351 4.147,8.085
3D body: height 0.85, standoff 0, extent 3.85,7.264 4.147,7.351
3D body: height 0.85, standoff 0.75, extent 3.85,6.807 4.147,7.264
3D body: height 0.1, standoff 0, extent 3.35,7.351 3.647,8.085
3D body: height 0.85, standoff 0, extent 3.35,7.264 3.647,7.351
3D body: height 0.85, standoff 0.75, extent 3.35,6.807 3.647,7.264
3D body: height 0.85, standoff 0.75, extent 4.85,6.807 5.147,7.264
3D body: height 0.85, standoff 0, extent 4.85,7.264 5.147,7.351
3D body: height 0.1, standoff 0, extent 4.85,7.351 5.147,8.085
3D body: height 0.85, standoff 0.75, extent 5.35,6.807 5.647,7.264
3D body: height 0.85, standoff 0, extent 5.35,7.264 5.647,7.351
3D body: height 0.1, standoff 0, extent 5.35,7.351 5.647,8.085
3D body: height 0.1, standoff 0, extent 5.85,7.351 6.147,8.085
3D body: height 0.85, standoff 0, extent 5.85,7.264 6.147,7.351
3D body: height 0.85, standoff 0.75, extent 5.85,6.807 6.147,7.264

## QTO247 + heatsick [mil]
pads (5):
  round 137.8 hole 78.74: 0(-136.34,194) 0(563.66,194)
  rect 110x180 hole 59.06: 1(3,1)
  oval 110x180 hole 59.06: 2(213.66,4) 3(422.32,4)
Top Overlay:
  region: 595,290 595,265 615,245 620,245 630,235 630,225 635,220 635,160 660,160 665,165 650,180 650,290
  region: 475,290 525,290 525,255 520,255 500,235 500,225 490,215 490,180 495,175 495,160 475,160
  region: -225,290 -175,290 -175,255 -180,255 -200,235 -200,225 -210,215 -210,180 -205,175 -205,160 -225,160
  region: -105,290 -105,265 -85,245 -80,245 -70,235 -70,225 -65,220 -65,160 -40,160 -35,165 -50,180 -50,290
  region: 140,290 190,290 190,240 170,220 170,180 190,160 140,160
  region: 230,290 290,290 290,150 280,160 230,160 250,180 250,220 230,240
  lines w10: -225,290 -175,290 -175,260 ; -173.69,257.87 ccw(c-135,195) -105.92,262.86 ; -163.31,220 ccw(c-134.15,190.85) -105,220 ; -105,265 -105,290 -55,290 ; 130,290 185,290 185,235 180,230 ; 181.96,229.73 ccw(c210.85,200.85) 239.73,229.73 ; 240,230 235,235 235,290 280,290 ; 475,290 525,290 525,260 ; 526.31,257.87 ccw(c565,195) 594.08,262.86 ; 595,265 595,290 645,290
  lines w35: -236.34,-156 -236.34,444 ; -42,149 -42,445 ; 129,149 129,445 ; 297,148 297,450 ; 471,148 471,448 ; 663.66,-156 663.66,444
  lines w40: -230,145 655,145
Mechanical 1:
  lines w10: -93.43,76.83 520.75,76.83 ; -93.43,-41.28 -93.43,135.89 520.75,135.89 520.75,-41.28 -93.43,-41.28
3D body "User Library-heat sink-1.STEP": height 1355.51, standoff 150, extent -240.79,-200.67 660.79,445
3D body "SW3dPS-TO-247.STEP": height 1060, standoff -360, extent -95,-105 505,75

## QTO-92 [mil] "TO-92"
height 200
pads (3):
  oval 66x100 hole 32: 1(-100,0) 2(0,0) 3(100,0)
Top Overlay:
  lines w7: -116.52,43.21 cw(c0.97,-12.43) 119.94,39.97 ; -115.34,-40.24 -98,-65 105,-65 118,-39
3D body "SW3dPS-TO92.STEP": height 385.04, standoff -59.79, extent -108.87,-65.56 108.87,95

## QTO-92A [mil] "TO-92"
height 200
pads (3):
  oval 66x100 hole 32: 1(100,0) 2(0,0) 3(-100,0)
Top Overlay:
  lines w7: -116.52,43.21 cw(c0.97,-12.43) 119.08,41.88 ; -115.34,-40.24 -98,-65 105,-65 118,-39
3D body "SW3dPS-TO92.STEP": height 385.04, standoff -59.79, extent -110,-60.56 107.74,100

## QTO-92B [mil] "TO-92"
height 200
pads (3):
  oval 70x100 hole 32: 1(-100,0) 2(0,100) 3(100,0)
Top Overlay:
  lines w7: -116.52,43.21 cw(c0.97,-12.43) -38.82,111.34 ; -115.34,-40.24 -98,-65 105,-65 118,-39 ; 36.81,113.84 cw(c2.42,-11.53) 121.49,40.65

## QTO-92B1 [mil] "TO-92"
height 200
pads (3):
  oval 75x100 hole 32: 1(-115,0) 2(0,0) 3(120,0)
Top Overlay:
  lines w7: -116.52,43.21 cw(c0.97,-12.43) -38.82,111.34 ; -115.34,-40.24 -98,-65 105,-65 118,-39 ; -40.42,111.21 cw(c2.42,-11.53) 121.49,40.65
3D body "SW3dPS-TO92.STEP": height 385.04, standoff -59.79, extent -112.74,-65.56 105,95

## QTO-92C [mil]
pads (3):
  oval 90x62 hole 36: 1(0,0) 2(100,-50) 3(0,-100)
Top Overlay:
  lines w10: -50,-150 -50,50 0,50 50,50 cw(c50,-50) 50,-150 0,-150 -50,-150 ; -13,-126.25 cw(c-13,-99.63) -13,-73 13,-73 cw(c13,-99.63) 13,-126.25 -13,-126.25 ; -13,-26.25 cw(c-13,0.37) -13,27 13,27 cw(c13,0.37) 13,-26.25 -13,-26.25 ; 87,-76.25 cw(c87,-49.63) 87,-23 113,-23 cw(c113,-49.63) 113,-76.25 87,-76.25

## QTO-204A [mil] "Pin For 2N3055, 2N2955"
pads (4):
  rect 120x120 hole 45: 1(0,0)
  round 120 hole 45: 2(0,430)
  round 220 hole 130: 3(665,215)
  round 200 hole 130: 4(-520,215)
Top Overlay:
  lines w10: -660,105 cw(c-560,205) -660,305 -179.46,654.16 ; -659.88,104.89 -178.69,-244.72 ; -179.53,654.34 cw(c18.37,195.17) 171.59,671.11 ; -178.9,-245.19 ccw(c28.37,209.83) 180.47,-266.47 ; 171.46,670.71 769.34,325.52 ; 180.28,-266.15 789.88,100.13 ccw(c695,205) 769.25,325.36

## QTO-220 [mil] "TO-220 - 1-2-3"
height 200
pads (3):
  rect 80x100 hole 39: 1(0,0)
  oval 80x100 hole 39: 2(100,0) 3(200,0)
Top Overlay:
  circle w10: c-72.03,-48 r12.97
  rectangle: -99,94 300,130
  lines w7: 298,107 299,93 ; -100,-75 -100,130 299,130 299,-75 300,-76 -76,-76 -99,-76 -100,-75
3D body "SW3dPS-TO220AB.STEP": height 904.72, standoff -250, extent -119,-64 322.46,120.65